# Altium footprint library VESC_MotorController.PcbLib: 146 footprints (part 4 of 10)
Each footprint in its own frame and in the unit in brackets; x right, y up, seen from the top. Pads: shape width x height; smd on the part's side, far side on the other; paste and mask are expansions set on the pad; w line width, h text height; cw(c..) or ccw(c..) is an arc to the next point about the centre after c.
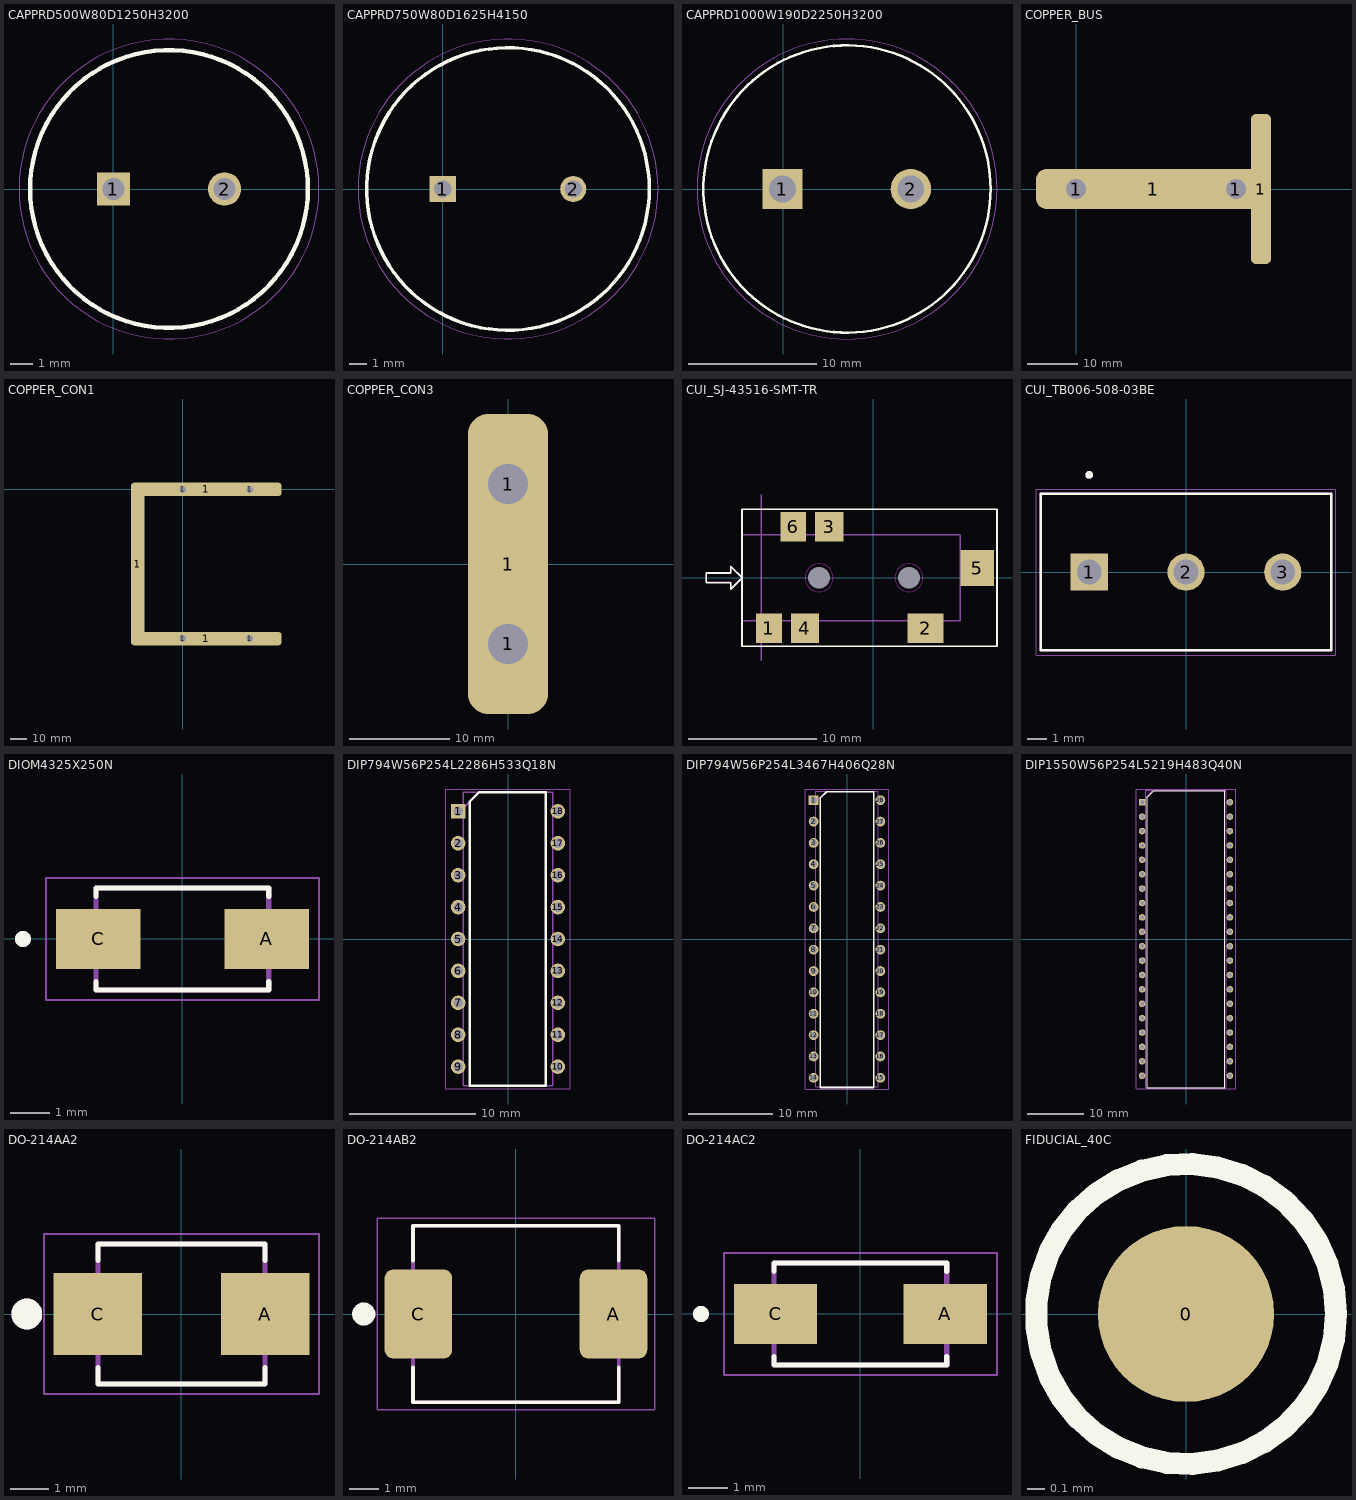
[diagram p3: the footprints below, top view; thin cyan lines are the x and y axes]

## CAPPRD500W80D1250H3200 [mm]
pads (2):
  rect 1.5x1.5 hole 1: 1(0,0)
  round 1.5 hole 1: 2(5,0)
Top Overlay:
  circle w0.2: c2.5,0 r6.25
Mechanical 15:
  circle w0.1: c2.5,0 r6.25
Mechanical 20:
  circle w0.05: c2.5,0 r6.75
3D body "EEU-FS1K471L.STEP": height 30, standoff -17, extent -3.688,-6.246 8.79,6.246

## CAPPRD750W80D1625H4150 [mm]
pads (2):
  rect 1.5x1.5 hole 1: 1(0,0)
  round 1.5 hole 1: 2(7.5,0)
Top Overlay:
  circle w0.2: c3.75,0 r8.125
Mechanical 15:
  circle w0.1: c3.75,0 r8.125
Mechanical 20:
  circle w0.05: c3.75,0 r8.625
3D body "UCY2C471MHD6.stp": height 41.5, standoff -10, extent -4.5,-8.25 12,8.25

## CAPPRD1000W190D2250H3200 [mm]
pads (2):
  rect 3.15x3.15 hole 2.1: 1(-0.064,0)
  round 3.15 hole 2.1: 2(10,0)
Top Overlay:
  circle w0.2: c5,0 r11.25
Mechanical 15:
  circle w0.1: c5,0 r11.25
Mechanical 20:
  circle w0.05: c5,0 r11.75
3D body "SLP471M160A3P3.stp": height 32, standoff -10, extent -6.5,-11.496 16.5,11.496

## COPPER_BUS [mm]
height 0.78
pads (4):
  round 6 hole 4: 1(0,0) 1(32,0)
  rrect50% 47x8 smd: 1(15.5,0)
  rrect50% 4x30 smd: 1(37,0)
Top Assembly:
  text "1" at -16.002,-58.61 h1.52
  text "1" at -12.128,-34.099 h1.52
3D body "CoperBus2.STP": height 5, standoff 0, extent -8,-15.5 39,15.5

## COPPER_CON1 [mm]
height 0.78
pads (7):
  rrect50% 8x97 smd: 1(-27,-44.5)
  round 6 hole 4: 1(0,-89) 1(0,0) 1(40,-89) 1(40,0)
  rrect50% 90x8 smd: 1(14,-89) 1(14,0)
3D body "CoperBus1.STP": height 38.5, standoff 0, extent -31,-93.1 59,3.9

## COPPER_CON3 [mm]
height 0.78
pads (3):
  round 6 hole 4: 1(0,-8) 1(0,8)
  rrect50% 8x30 smd: 1(0,0)
Top Assembly:
  text "1" at -16.002,-58.61 h1.52
3D body "CoperBus3.STP": height 38.5, standoff 0, extent -4,-15 4,15

## CUI_SJ-43516-SMT-TR [mm] "CONN JACK 4COND 3.5MM SMD R/A,SJ-43516-SMT-TR"
height 5
pads (8):
  rect 2x2.3 smd mask+0.051: 1(-8.1,-3.95) 6(-6.2,3.95)
  rect 2.8x2.3 smd mask+0.051: 2(4.1,-3.95)
  rect 2.2x2.3 smd mask+0.051: 3(-3.4,3.95) 4(-5.3,-3.95)
  rect 2.6x2.8 smd mask+0.051: 5(8.1,0.75)
  round 0 hole 1.7 unplated mask+0.051: ""(-4.2,0) ""(2.8,0)
Top Overlay:
  lines w0.127: -11.08,0.372 -12.985,0.372 -12.985,-0.39 -11.08,-0.39 -11.08,-0.898 -10.191,-0.009 -11.08,0.88 -11.08,0.373 ; -10.2,-5.334 9.652,-5.334 9.652,5.334 -10.2,5.334 -10.2,-5.334
Keep-Out Layer:
  circle w0.051: c2.8,0 r1.089
  circle w0.051: c-4.2,0 r1.089
Mechanical 13:
  lines w0.102: -11.08,0.39 -12.985,0.39 -12.985,-0.372 -11.08,-0.372 -11.08,-0.88 -10.191,0.009 -11.08,0.898 -11.08,0.392 ; -8.7,-6.477 -8.7,-3.35 -8.7,3.35 -8.7,6.477 ; -10.2,-3.35 6.8,-3.35 6.8,3.35 -10.2,3.35 -10.2,-3.35
  text ".Designator" at -1.302,0.331 h1.02
3D body "SJ-43516-SMT-TR.step": height 5.1, standoff -0.7, extent -10.4,-4.5 8.8,4.5

## CUI_TB006-508-03BE [mm]
pads (3):
  rect 1.95x1.95 / inner round 1.95 / far side rect 1.95x1.95 hole 1.3: 1(-5.08,0)
  round 1.95 hole 1.3: 2(0,0) 3(5.08,0)
Top Overlay:
  circle w0.2: c-5.08,5.1 r0.1
  lines w0.127: -7.62,-4.1 -7.62,4.1 7.62,4.1 7.62,-4.1 -7.62,-4.1
Mechanical 13:
  circle w0.2: c-5.08,5.1 r0.1
  lines w0.127: -7.62,-4.1 -7.62,4.1 7.62,4.1 7.62,-4.1 -7.62,-4.1
Mechanical 15:
  lines w0.05: -7.87,-4.35 7.87,-4.35 7.87,4.35 -7.87,4.35 -7.87,-4.35
3D body "step_temp.STEP": height 10, standoff -3.8, extent -8.12,-4.1 7.62,4.1

## DIOM4325X250N [mm]
pads (2):
  rect 2.12x1.5 smd: A(2.115,0) C(-2.115,0)
Top Overlay:
  circle w0.2: c-4,0 r0.1
  lines w0.127: -2.165,-1.07 -2.165,-1.28 2.165,-1.28 2.165,-1.07 ; -2.165,1.07 -2.165,1.28 2.165,1.28 2.165,1.07
Mechanical 13:
  circle w0.2: c-4,0 r0.1
  lines w0.127: -2.165,-1.28 -2.165,1.28 2.165,1.28 2.165,-1.28 -2.165,-1.28
Mechanical 15:
  lines w0.05: -3.425,-1.53 -3.425,1.53 3.425,1.53 3.425,-1.53 -3.425,-1.53
3D body "step_temp.STEP": height 2.5, standoff 0, extent -2.57,-1.28 2.57,1.28

## DIP794W56P254L2286H533Q18N [mm]
pads (18):
  rect 1.159x1.159 hole 0.759: 1(-3.969,10.16)
  round 1.159 hole 0.759: 2(-3.969,7.62) 3(-3.969,5.08) 4(-3.969,2.54) 5(-3.969,0) 6(-3.969,-2.54) 7(-3.969,-5.08) 8(-3.969,-7.62) 9(-3.969,-10.16) 10(3.969,-10.16) 11(3.969,-7.62) 12(3.969,-5.08) 13(3.969,-2.54) 14(3.969,0) 15(3.969,2.54) 16(3.969,5.08) 17(3.969,7.62) 18(3.969,10.16)
Top Overlay:
  lines w0.2: -3.048,-11.684 3.019,-11.684 3.019,11.684 -2.286,11.684 -3.048,10.922 -3.048,-11.684
Mechanical 15:
  lines w0.1: -3.556,10.414 -2.286,11.684 ; -3.556,-11.684 -3.556,11.684 3.556,11.684 3.556,-11.684 -3.556,-11.684
Mechanical 20:
  lines w0.05: -4.957,-11.934 -4.957,11.934 4.957,11.934 4.957,-11.934 -4.957,-11.934
3D body "PIC16F716-E_P.stp": height 5.33, standoff -3.5, extent -4.109,-11.43 4.109,11.43

## DIP794W56P254L3467H406Q28N [mm]
pads (28):
  rect 1.16x1.16 hole 0.76: 1(-3.97,16.51)
  round 1.16 hole 0.76: 2(-3.97,13.97) 3(-3.97,11.43) 4(-3.97,8.89) 5(-3.97,6.35) 6(-3.97,3.81) 7(-3.97,1.27) 8(-3.97,-1.27) 9(-3.97,-3.81) 10(-3.97,-6.35) 11(-3.97,-8.89) 12(-3.97,-11.43) 13(-3.97,-13.97) 14(-3.97,-16.51) 15(3.97,-16.51) 16(3.97,-13.97) 17(3.97,-11.43) 18(3.97,-8.89) 19(3.97,-6.35) 20(3.97,-3.81) 21(3.97,-1.27) 22(3.97,1.27) 23(3.97,3.81) 24(3.97,6.35) 25(3.97,8.89) 26(3.97,11.43) 27(3.97,13.97) 28(3.97,16.51)
Top Overlay:
  lines w0.2: -3.175,-17.653 -3.175,16.764 -2.413,17.526 3.175,17.526 3.175,-17.653 -3.175,-17.653
Mechanical 15:
  lines w0.1: -3.745,16.32 -2.475,17.59 ; -3.745,-17.59 3.745,-17.59 3.745,17.59 -3.745,17.59 -3.745,-17.59
Mechanical 20:
  lines w0.05: -4.96,-17.84 4.96,-17.84 4.96,17.84 -4.96,17.84 -4.96,-17.84
3D body "PIC16F73-I_SP.STEP": height 5.08, standoff -3.81, extent -4.064,-17.335 4.064,17.336

## DIP1550W56P254L5219H483Q40N [mm]
pads (40):
  rect 1.16x1.16 hole 0.76: 1(-7.748,24.13)
  round 1.16 hole 0.76: 2(-7.748,21.59) 3(-7.748,19.05) 4(-7.748,16.51) 5(-7.748,13.97) 6(-7.748,11.43) 7(-7.748,8.89) 8(-7.748,6.35) 9(-7.748,3.81) 10(-7.748,1.27) 11(-7.748,-1.27) 12(-7.748,-3.81) 13(-7.748,-6.35) 14(-7.748,-8.89) 15(-7.748,-11.43) 16(-7.748,-13.97) 17(-7.748,-16.51) 18(-7.748,-19.05) 19(-7.748,-21.59) 20(-7.748,-24.13) 21(7.748,-24.13) 22(7.748,-21.59) 23(7.748,-19.05) 24(7.748,-16.51) 25(7.748,-13.97) 26(7.748,-11.43) 27(7.748,-8.89) 28(7.748,-6.35) 29(7.748,-3.81) 30(7.748,-1.27) 31(7.748,1.27) 32(7.748,3.81) 33(7.748,6.35) 34(7.748,8.89) 35(7.748,11.43) 36(7.748,13.97) 37(7.748,16.51) 38(7.748,19.05) 39(7.748,21.59) 40(7.748,24.13)
Top Overlay:
  lines w0.2: -6.854,-26.225 6.858,-26.229 ; -6.851,-26.203 -6.858,-26.196 -6.858,25.019 -5.715,26.162 6.858,26.162 6.858,-26.196
Mechanical 15:
  lines w0.1: -7.11,24.955 -5.84,26.225 ; -7.11,-26.225 7.11,-26.225 7.11,26.225 -7.11,26.225 -7.11,-26.225
Mechanical 20:
  lines w0.05: -8.77,-26.475 8.77,-26.475 8.77,26.475 -8.77,26.475 -8.77,-26.475
3D body "PIC16F74-I_P.stp": height 4.83, standoff -3.5, extent -7.888,-26.097 7.888,26.097

## DO-214AA2 [mm]
pads (2):
  rect 2.28x2.12 smd: A(2.165,0) C(-2.165,0)
Top Overlay:
  circle w0.4: c-4,0 r0.2
  lines w0.127: -2.163,-1.38 -2.163,-1.813 2.163,-1.813 2.163,-1.38 ; -2.163,1.38 -2.163,1.813 2.163,1.813 2.163,1.38
Mechanical 13:
  circle w0.4: c-4,0 r0.2
  lines w0.127: -2.163,-1.813 -2.163,1.813 2.163,1.813 2.163,-1.813 -2.163,-1.813
Mechanical 15:
  lines w0.05: -3.555,-2.063 -3.555,2.063 3.555,2.063 3.555,-2.063 -3.555,-2.063
3D body "step_temp.STEP": height 2.46, standoff 0, extent -2.718,-1.778 2.718,1.778

## DO-214AB2 [mm]
pads (2):
  rrect25% 2.33x3.07 smd: A(3.365,0) C(-3.365,0)
Top Overlay:
  circle w0.4: c-5.25,0 r0.2
  lines w0.127: -3.55,-1.849 -3.55,-3.05 3.55,-3.05 3.55,-1.849 ; -3.55,1.849 -3.55,3.05 3.55,3.05 3.55,1.849
Mechanical 13:
  lines w0.127: -3.55,-3.05 -3.55,3.05 3.55,3.05 3.55,-3.05 -3.55,-3.05
Mechanical 15:
  lines w0.05: -4.78,-3.3 4.78,-3.3 4.78,3.3 -4.78,3.3 -4.78,-3.3
3D body "B540C-13-F.stp": height 2.5, standoff 0, extent -3.97,-2.952 3.97,2.953

## DO-214AC2 [mm]
height 2.5
pads (2):
  rect 2.09x1.5 smd: A(2.13,0) C(-2.13,0)
Top Overlay:
  circle w0.2: c-4,0 r0.1
  lines w0.127: -2.165,-1.07 -2.165,-1.28 2.165,-1.28 2.165,-1.07 ; -2.165,1.07 -2.165,1.28 2.165,1.28 2.165,1.07
Mechanical 13:
  circle w0.2: c-4,0 r0.1
  lines w0.127: -2.165,-1.28 -2.165,1.28 2.165,1.28 2.165,-1.28 -2.165,-1.28
Mechanical 15:
  lines w0.05: -3.425,-1.53 -3.425,1.53 3.425,1.53 3.425,-1.53 -3.425,-1.53
3D body "step_temp.STEP": height 2.5, standoff 0, extent -2.57,-1.28 2.57,1.28

## FIDUCIAL_40C [mil] "GLOBAL FIDUCIAL"
height 590.55
pads (1):
  round 40 smd paste-78.74 mask+10: 0(0,0)
Top Layer keep-out:
  circle w2: c0,0 r34
Top Overlay:
  circle w5: c0,0 r34
Mechanical 13:
  circle w4: c0,0 r34
  text ".Designator" at 55.03,36.81 h40